# Altium footprint library 我的器件.PCBLIB: 450 footprints (part 9 of 29)
Each footprint in its own frame and in the unit in brackets; x right, y up, seen from the top. Pads: shape width x height; smd on the part's side, far side on the other; paste and mask are expansions set on the pad; w line width, h text height; cw(c..) or ccw(c..) is an arc to the next point about the centre after c.
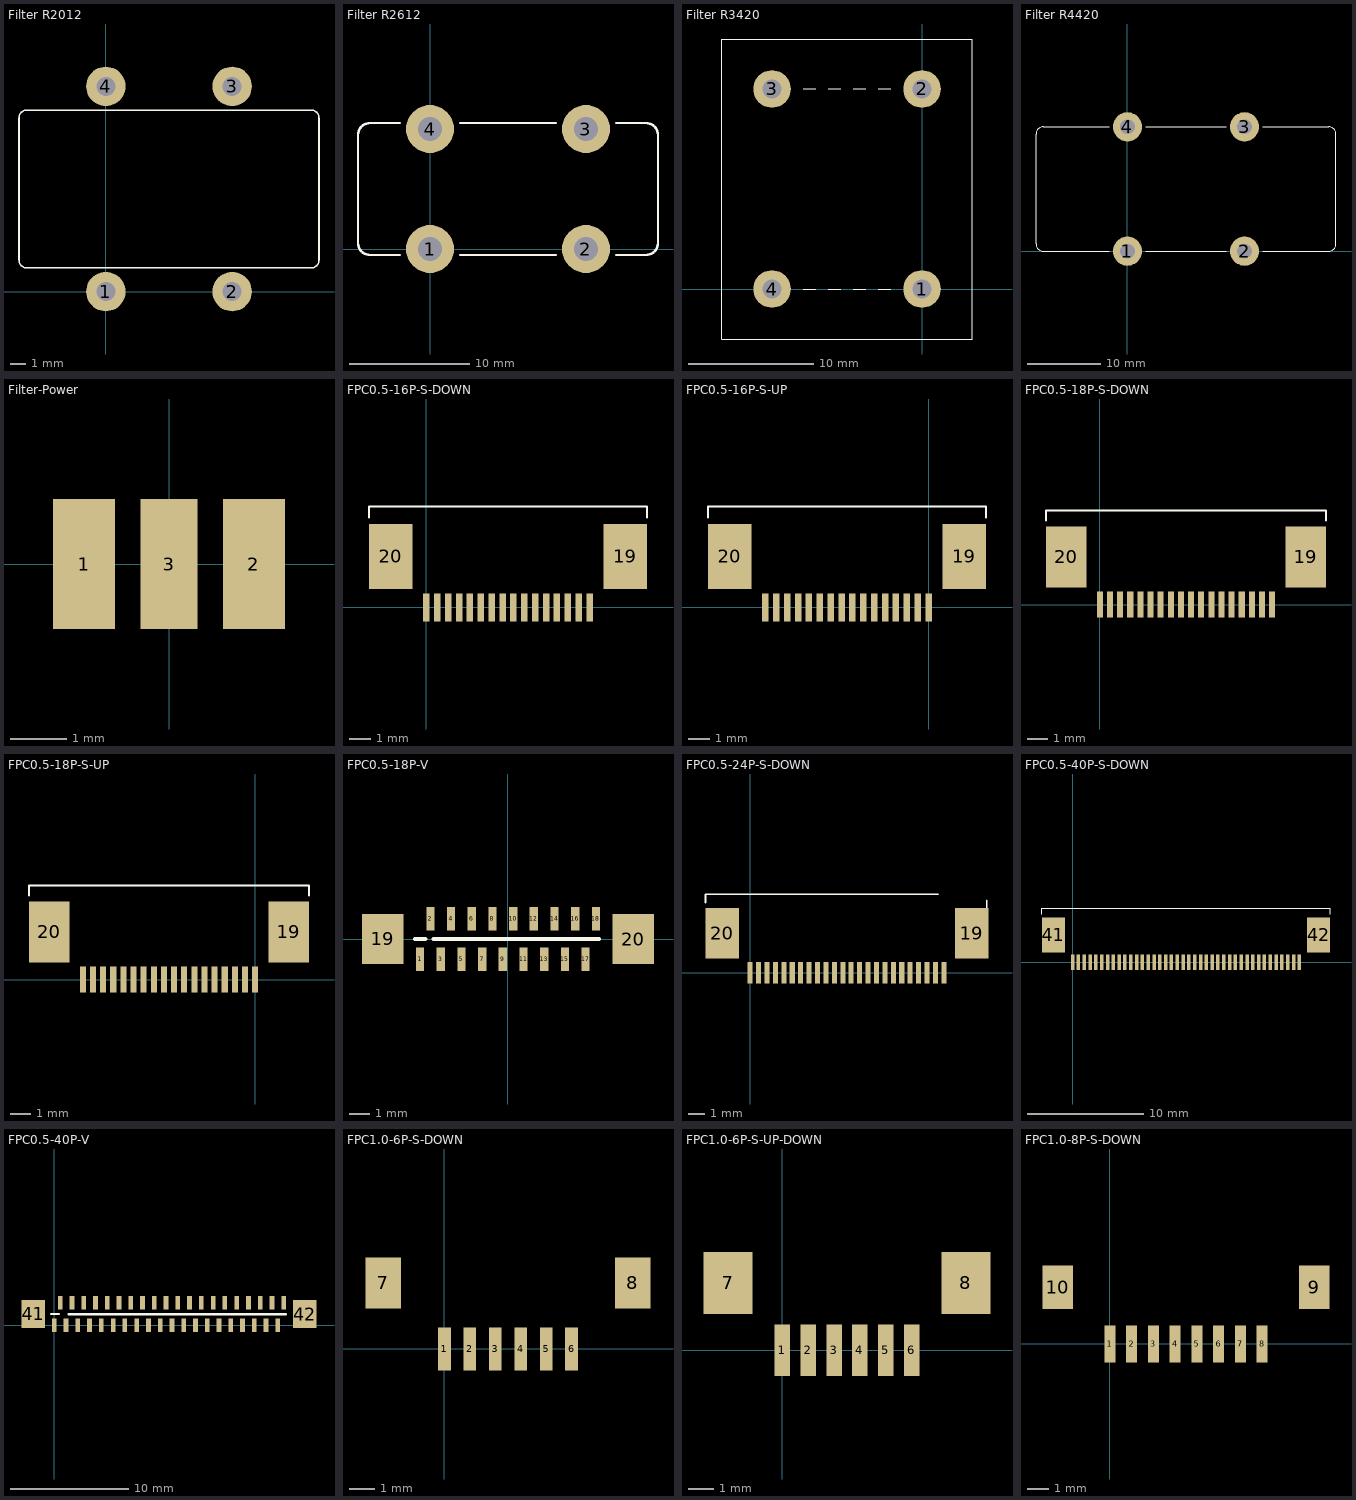
[diagram p8: the footprints below, top view; thin cyan lines are the x and y axes]

## Filter R2012 [mm]
pads (4):
  round 2.5 hole 1.2: 1(0,0) 2(8,0) 3(8,13) 4(0,13)
Top Overlay:
  lines w0.1: -5.5,2 ccw(c-5,2) -5,1.5 13,1.5 ccw(c13,2) 13.5,2 13.5,11 ccw(c13,11) 13,11.5 -5,11.5 ccw(c-5,11) -5.5,11 -5.5,2
3D body: height 6.1, standoff 1.66, extent -0.998,10.56 0.998,13.8
3D body: height 3, standoff -2, extent -0.399,12.6 0.399,13.397
3D body: height 6.1, standoff 1.66, extent 7.002,10.56 8.998,13.8
3D body: height 3, standoff -2, extent 7.601,12.6 8.399,13.397
3D body: height 6.1, standoff 1.66, extent 7.002,-0.8 8.998,2.44
3D body: height 3, standoff -2, extent 7.601,-0.397 8.399,0.4
3D body: height 3, standoff -2, extent -0.399,-0.397 0.399,0.4
3D body: height 6.1, standoff 1.66, extent -0.998,-0.8 0.998,2.44
3D body: height 19.92, standoff 0, extent -6.061,0.5 13.9,12.5

## Filter R2612 [mm]
pads (4):
  round 4 hole 2: 1(0,0) 2(13,0) 3(13,10) 4(0,10)
Top Overlay:
  lines w0.2: -2.5,-0.5 -5,-0.5 cw(c-5,0.5) -6,0.5 -6,9.5 cw(c-5,9.5) -5,10.5 -2.5,10.5 ; 2.5,-0.5 10.5,-0.5 ; 2.5,10.5 10.5,10.5 ; 15.5,-0.5 18,-0.5 ccw(c18,0.5) 19,0.5 19,9.5 ccw(c18,9.5) 18,10.5 15.5,10.5
3D body: height 25.9, standoff 0, extent -6.449,-1 19.5,11

## Filter R3420 [mm]
pads (4):
  round 3 hole 1.5: 1(0,0) 2(0,16) 3(-12,16) 4(-12,0)
Top Overlay:
  lines w0.1: -9.5,0 -8.5,0 ; -9.5,16 -8.5,16 ; -7.5,0 -6.5,0 ; -7.5,16 -6.5,16 ; -5.5,0 -4.5,0 ; -5.5,16 -4.5,16 ; -3.5,0 -2.5,0 ; -3.5,16 -2.5,16 ; -16,-4 -16,20 4,20 4,-4 -16,-4
3D body: height 34.87, standoff 1, extent -16.3,-9 4.3,24.933
3D body: height 1.6, standoff 0, extent -16,-4 4,20

## Filter R4420 [mm]
pads (4):
  round 4 hole 2: 1(0,0) 2(16,0) 3(16,17) 4(0,17)
Top Overlay:
  lines w0.1: -2.5,0 -11.5,0 cw(c-11.5,1) -12.5,1 -12.5,16 cw(c-11.5,16) -11.5,17 -2.5,17 ; 2.5,0 11.5,0 ; 2.5,17 11.5,17 ; 4.5,0 13.5,0 ; 4.5,17 13.5,17 ; 18.5,0 27.5,0 ccw(c27.5,1) 28.5,1 28.5,16 ccw(c27.5,16) 27.5,17 18.5,17
3D body: height 43.83, standoff 0, extent -13.957,-1.6 29.957,18.4

## Filter-Power [mm]
pads (3):
  rect 1.1x2.3 smd: 1(-1.5,0) 2(1.5,0)
  rect 1x2.3 smd: 3(0,0)
3D body: height 1.5, standoff 0, extent -0.5,-0.75 0.5,0.75
3D body: height 1.5, standoff 0, extent 1,-0.747 1.6,0.747
3D body: height 1.5, standoff 0, extent -1.6,-0.747 -1,0.747
3D body: height 1.35, standoff 0.15, extent -1.5,-0.6 1.5,0.595

## FPC0.5-16P-S-DOWN [mm]
pads (18):
  rect 0.3x1.3 smd: 1(0,0) 2(0.5,0) 3(1,0) 4(1.5,0) 5(2,0) 6(2.5,0) 7(3,0) 8(3.5,0) 9(4,0) 10(4.5,0) 11(5,0) 12(5.5,0) 13(6,0) 14(6.5,0) 15(7,0) 16(7.5,0)
  rect 2x3 smd: 19(9.15,2.35) 20(-1.65,2.35)
Top Overlay:
  lines w0.1: -2.65,4.15 -2.65,4.65 10.15,4.65 10.15,4.15
3D body: height 2, standoff 0.2, extent 8.05,3.675 10.55,4.875
3D body: height 1.9, standoff 0.1, extent 7.975,0.575 9.875,4.375
3D body: height 2, standoff 0, extent 8.25,0.5 10,3.575
3D body: height 1.7, standoff 0.3, extent 8.25,0.475 9.9,0.575
3D body: height 1.5, standoff 0.5, extent 9.9,0.475 10,1.075
3D body: height 2, standoff 0, extent 8.25,1.075 10,3.675
3D body: height 2, standoff 0, extent -2.5,1.075 -0.75,3.675
3D body: height 1.5, standoff 0.5, extent -2.5,0.475 -2.4,1.075
3D body: height 1.7, standoff 0.3, extent -2.4,0.475 -0.75,0.575
3D body: height 2, standoff 0, extent -2.5,0.5 -0.75,3.575
3D body: height 1.9, standoff 0.1, extent -2.375,0.675 9.85,0.875
3D body: height 1.9, standoff 0.1, extent -2.375,0.575 -0.475,4.375
3D body: height 0.5, standoff 0.1, extent -2.375,0.575 9.85,4.675
3D body: height 2, standoff 1.1, extent -0.55,3.675 9.05,4.875
3D body: height 2, standoff 0.2, extent -3.05,3.675 -0.55,4.875
3D body: height 1.9, standoff 1.5, extent -2.375,0.575 9.85,3.675
3D body: height 1.7, standoff 0.2, extent 3.9,0.475 4.1,0.775
3D body: height 0.3, standoff 0, extent 3.9,-0.325 4.1,0.525
3D body: height 1.7, standoff 0.2, extent 4.4,0.475 4.6,0.775
3D body: height 0.3, standoff 0, extent 4.4,-0.325 4.6,0.525
3D body: height 1.7, standoff 0.2, extent 4.9,0.475 5.1,0.775
3D body: height 0.3, standoff 0, extent 4.9,-0.325 5.1,0.525
3D body: height 1.7, standoff 0.2, extent 5.4,0.475 5.6,0.775
3D body: height 0.3, standoff 0, extent 5.4,-0.325 5.6,0.525
3D body: height 1.7, standoff 0.2, extent 5.9,0.475 6.1,0.775
3D body: height 0.3, standoff 0, extent 5.9,-0.325 6.1,0.525
3D body: height 1.7, standoff 0.2, extent 6.4,0.475 6.6,0.775
3D body: height 0.3, standoff 0, extent 6.4,-0.325 6.6,0.525
3D body: height 1.7, standoff 0.2, extent 6.9,0.475 7.1,0.775
3D body: height 0.3, standoff 0, extent 6.9,-0.325 7.1,0.525
3D body: height 1.7, standoff 0.2, extent 7.4,0.475 7.6,0.775
3D body: height 0.3, standoff 0, extent 7.4,-0.325 7.6,0.525
3D body: height 0.3, standoff 0, extent -0.1,-0.325 0.1,0.525
3D body: height 1.7, standoff 0.2, extent -0.1,0.475 0.1,0.775
3D body: height 0.3, standoff 0, extent 0.4,-0.325 0.6,0.525
3D body: height 1.7, standoff 0.2, extent 0.4,0.475 0.6,0.775
3D body: height 0.3, standoff 0, extent 0.9,-0.325 1.1,0.525
3D body: height 1.7, standoff 0.2, extent 0.9,0.475 1.1,0.775
3D body: height 0.3, standoff 0, extent 1.4,-0.325 1.6,0.525
3D body: height 1.7, standoff 0.2, extent 1.4,0.475 1.6,0.775
3D body: height 0.3, standoff 0, extent 1.9,-0.325 2.1,0.525
3D body: height 1.7, standoff 0.2, extent 1.9,0.475 2.1,0.775
3D body: height 0.3, standoff 0, extent 2.4,-0.325 2.6,0.525
3D body: height 1.7, standoff 0.2, extent 2.4,0.475 2.6,0.775
3D body: height 0.3, standoff 0, extent 2.9,-0.325 3.1,0.525
3D body: height 1.7, standoff 0.2, extent 2.9,0.475 3.1,0.775
3D body: height 0.3, standoff 0, extent 3.4,-0.325 3.6,0.525
3D body: height 1.7, standoff 0.2, extent 3.4,0.475 3.6,0.775

## FPC0.5-16P-S-UP [mm]
pads (18):
  rect 0.3x1.3 smd: 1(0,0) 2(-0.5,0) 3(-1,0) 4(-1.5,0) 5(-2,0) 6(-2.5,0) 7(-3,0) 8(-3.5,0) 9(-4,0) 10(-4.5,0) 11(-5,0) 12(-5.5,0) 13(-6,0) 14(-6.5,0) 15(-7,0) 16(-7.5,0)
  rect 2x3 smd: 19(1.65,2.35) 20(-9.15,2.35)
Top Overlay:
  lines w0.1: -10.15,4.15 -10.15,4.65 2.65,4.65 2.65,4.15
3D body: height 2, standoff 0, extent 0.75,1.075 2.5,3.675
3D body: height 1.5, standoff 0.5, extent 2.4,0.475 2.5,1.075
3D body: height 1.7, standoff 0.3, extent 0.75,0.475 2.4,0.575
3D body: height 2, standoff 0, extent 0.75,0.5 2.5,3.575
3D body: height 1.9, standoff 0.1, extent 0.475,0.575 2.375,4.375
3D body: height 2, standoff 0.2, extent 0.55,3.675 3.05,4.875
3D body: height 1.7, standoff 0.2, extent -5.1,0.475 -4.9,0.775
3D body: height 0.3, standoff 0, extent -5.1,-0.325 -4.9,0.525
3D body: height 1.7, standoff 0.2, extent -5.6,0.475 -5.4,0.775
3D body: height 0.3, standoff 0, extent -5.6,-0.325 -5.4,0.525
3D body: height 1.7, standoff 0.2, extent -6.1,0.475 -5.9,0.775
3D body: height 0.3, standoff 0, extent -6.1,-0.325 -5.9,0.525
3D body: height 1.7, standoff 0.2, extent -6.6,0.475 -6.4,0.775
3D body: height 0.3, standoff 0, extent -6.6,-0.325 -6.4,0.525
3D body: height 1.7, standoff 0.2, extent -7.1,0.475 -6.9,0.775
3D body: height 0.3, standoff 0, extent -7.1,-0.325 -6.9,0.525
3D body: height 1.7, standoff 0.2, extent -7.6,0.475 -7.4,0.775
3D body: height 0.3, standoff 0, extent -7.6,-0.325 -7.4,0.525
3D body: height 0.3, standoff 0, extent -0.1,-0.325 0.1,0.525
3D body: height 1.7, standoff 0.2, extent -0.1,0.475 0.1,0.775
3D body: height 0.3, standoff 0, extent -0.6,-0.325 -0.4,0.525
3D body: height 1.7, standoff 0.2, extent -0.6,0.475 -0.4,0.775
3D body: height 0.3, standoff 0, extent -1.1,-0.325 -0.9,0.525
3D body: height 1.7, standoff 0.2, extent -1.1,0.475 -0.9,0.775
3D body: height 0.3, standoff 0, extent -1.6,-0.325 -1.4,0.525
3D body: height 1.7, standoff 0.2, extent -1.6,0.475 -1.4,0.775
3D body: height 0.3, standoff 0, extent -2.1,-0.325 -1.9,0.525
3D body: height 1.7, standoff 0.2, extent -2.1,0.475 -1.9,0.775
3D body: height 0.3, standoff 0, extent -2.6,-0.325 -2.4,0.525
3D body: height 1.7, standoff 0.2, extent -2.6,0.475 -2.4,0.775
3D body: height 0.3, standoff 0, extent -3.1,-0.325 -2.9,0.525
3D body: height 1.7, standoff 0.2, extent -3.1,0.475 -2.9,0.775
3D body: height 0.3, standoff 0, extent -3.6,-0.325 -3.4,0.525
3D body: height 1.7, standoff 0.2, extent -3.6,0.475 -3.4,0.775
3D body: height 0.3, standoff 0, extent -4.1,-0.325 -3.9,0.525
3D body: height 1.7, standoff 0.2, extent -4.1,0.475 -3.9,0.775
3D body: height 0.3, standoff 0, extent -4.6,-0.325 -4.4,0.525
3D body: height 1.7, standoff 0.2, extent -4.6,0.475 -4.4,0.775
3D body: height 0.5, standoff 0.1, extent -9.9,0.575 2.4,3.675
3D body: height 0.9, standoff 0, extent -9.05,3.675 0.55,4.875
3D body: height 1.9, standoff 1.4, extent -9.9,0.575 2.4,4.675
3D body: height 1.9, standoff 0.1, extent -9.85,0.675 2.4,0.875
3D body: height 2, standoff 0, extent -10,1.075 -8.25,3.675
3D body: height 1.5, standoff 0.5, extent -10,0.475 -9.9,1.075
3D body: height 1.7, standoff 0.3, extent -9.9,0.475 -8.25,0.575
3D body: height 2, standoff 0, extent -10,0.5 -8.25,3.575
3D body: height 1.9, standoff 0.1, extent -9.875,0.575 -7.975,4.375
3D body: height 2, standoff 0.2, extent -10.55,3.675 -8.05,4.875

## FPC0.5-18P-S-DOWN [mm]
pads (20):
  rect 0.3x1.3 smd: 1(0,0) 2(0.5,0) 3(1,0) 4(1.5,0) 5(2,0) 6(2.5,0) 7(3,0) 8(3.5,0) 9(4,0) 10(4.5,0) 11(5,0) 12(5.5,0) 13(6,0) 14(6.5,0) 15(7,0) 16(7.5,0) 17(8,0) 18(8.5,0)
  rect 2x3 smd: 19(10.15,2.35) 20(-1.65,2.35)
Top Overlay:
  lines w0.1: -2.65,4.15 -2.65,4.65 11.15,4.65 11.15,4.15
3D body: height 2, standoff 0, extent 9.25,1.075 11,3.675
3D body: height 1.5, standoff 0.5, extent 10.9,0.475 11,1.075
3D body: height 1.7, standoff 0.3, extent 9.25,0.475 10.9,0.575
3D body: height 2, standoff 0, extent 9.25,0.5 11,3.575
3D body: height 1.9, standoff 0.1, extent 8.975,0.575 10.875,4.375
3D body: height 2, standoff 0.2, extent 9.05,3.675 11.55,4.875
3D body: height 2, standoff 0, extent -2.5,1.075 -0.75,3.675
3D body: height 1.5, standoff 0.5, extent -2.5,0.475 -2.4,1.075
3D body: height 1.7, standoff 0.3, extent -2.4,0.475 -0.75,0.575
3D body: height 2, standoff 0, extent -2.5,0.5 -0.75,3.575
3D body: height 1.9, standoff 0.1, extent -2.375,0.675 10.9,0.875
3D body: height 1.9, standoff 0.1, extent -2.375,0.575 -0.475,4.375
3D body: height 0.5, standoff 0.1, extent -2.375,0.575 10.9,4.675
3D body: height 2, standoff 1.1, extent -0.55,3.675 9.05,4.875
3D body: height 2, standoff 0.2, extent -3.05,3.675 -0.55,4.875
3D body: height 1.9, standoff 1.5, extent -2.375,0.575 10.9,3.675
3D body: height 1.7, standoff 0.2, extent 3.9,0.475 4.1,0.775
3D body: height 0.3, standoff 0, extent 3.9,-0.325 4.1,0.525
3D body: height 1.7, standoff 0.2, extent 4.4,0.475 4.6,0.775
3D body: height 0.3, standoff 0, extent 4.4,-0.325 4.6,0.525
3D body: height 1.7, standoff 0.2, extent 4.9,0.475 5.1,0.775
3D body: height 0.3, standoff 0, extent 4.9,-0.325 5.1,0.525
3D body: height 1.7, standoff 0.2, extent 5.4,0.475 5.6,0.775
3D body: height 0.3, standoff 0, extent 5.4,-0.325 5.6,0.525
3D body: height 1.7, standoff 0.2, extent 5.9,0.475 6.1,0.775
3D body: height 0.3, standoff 0, extent 5.9,-0.325 6.1,0.525
3D body: height 1.7, standoff 0.2, extent 6.4,0.475 6.6,0.775
3D body: height 0.3, standoff 0, extent 6.4,-0.325 6.6,0.525
3D body: height 1.7, standoff 0.2, extent 6.9,0.475 7.1,0.775
3D body: height 0.3, standoff 0, extent 6.9,-0.325 7.1,0.525
3D body: height 1.7, standoff 0.2, extent 7.4,0.475 7.6,0.775
3D body: height 0.3, standoff 0, extent 7.4,-0.325 7.6,0.525
3D body: height 1.7, standoff 0.2, extent 7.9,0.475 8.1,0.775
3D body: height 0.3, standoff 0, extent 7.9,-0.325 8.1,0.525
3D body: height 1.7, standoff 0.2, extent 8.4,0.475 8.6,0.775
3D body: height 0.3, standoff 0, extent 8.4,-0.325 8.6,0.525
3D body: height 0.3, standoff 0, extent -0.1,-0.325 0.1,0.525
3D body: height 1.7, standoff 0.2, extent -0.1,0.475 0.1,0.775
3D body: height 0.3, standoff 0, extent 0.4,-0.325 0.6,0.525
3D body: height 1.7, standoff 0.2, extent 0.4,0.475 0.6,0.775
3D body: height 0.3, standoff 0, extent 0.9,-0.325 1.1,0.525
3D body: height 1.7, standoff 0.2, extent 0.9,0.475 1.1,0.775
3D body: height 0.3, standoff 0, extent 1.4,-0.325 1.6,0.525
3D body: height 1.7, standoff 0.2, extent 1.4,0.475 1.6,0.775
3D body: height 0.3, standoff 0, extent 1.9,-0.325 2.1,0.525
3D body: height 1.7, standoff 0.2, extent 1.9,0.475 2.1,0.775
3D body: height 0.3, standoff 0, extent 2.4,-0.325 2.6,0.525
3D body: height 1.7, standoff 0.2, extent 2.4,0.475 2.6,0.775
3D body: height 0.3, standoff 0, extent 2.9,-0.325 3.1,0.525
3D body: height 1.7, standoff 0.2, extent 2.9,0.475 3.1,0.775
3D body: height 0.3, standoff 0, extent 3.4,-0.325 3.6,0.525
3D body: height 1.7, standoff 0.2, extent 3.4,0.475 3.6,0.775

## FPC0.5-18P-S-UP [mm]
pads (20):
  rect 0.3x1.3 smd: 1(0,0) 2(-0.5,0) 3(-1,0) 4(-1.5,0) 5(-2,0) 6(-2.5,0) 7(-3,0) 8(-3.5,0) 9(-4,0) 10(-4.5,0) 11(-5,0) 12(-5.5,0) 13(-6,0) 14(-6.5,0) 15(-7,0) 16(-7.5,0) 17(-8,0) 18(-8.5,0)
  rect 2x3 smd: 19(1.65,2.35) 20(-10.15,2.35)
Top Overlay:
  lines w0.1: -11.15,4.15 -11.15,4.65 2.65,4.65 2.65,4.15
3D body: height 2, standoff 0, extent 0.75,1.075 2.5,3.675
3D body: height 1.5, standoff 0.5, extent 2.4,0.475 2.5,1.075
3D body: height 1.7, standoff 0.3, extent 0.75,0.475 2.4,0.575
3D body: height 2, standoff 0, extent 0.75,0.5 2.5,3.575
3D body: height 1.9, standoff 0.1, extent 0.475,0.575 2.375,4.375
3D body: height 2, standoff 0.2, extent 0.55,3.675 3.05,4.875
3D body: height 1.7, standoff 0.2, extent -5.1,0.475 -4.9,0.775
3D body: height 0.3, standoff 0, extent -5.1,-0.325 -4.9,0.525
3D body: height 1.7, standoff 0.2, extent -5.6,0.475 -5.4,0.775
3D body: height 0.3, standoff 0, extent -5.6,-0.325 -5.4,0.525
3D body: height 1.7, standoff 0.2, extent -6.1,0.475 -5.9,0.775
3D body: height 0.3, standoff 0, extent -6.1,-0.325 -5.9,0.525
3D body: height 1.7, standoff 0.2, extent -6.6,0.475 -6.4,0.775
3D body: height 0.3, standoff 0, extent -6.6,-0.325 -6.4,0.525
3D body: height 1.7, standoff 0.2, extent -7.1,0.475 -6.9,0.775
3D body: height 0.3, standoff 0, extent -7.1,-0.325 -6.9,0.525
3D body: height 1.7, standoff 0.2, extent -7.6,0.475 -7.4,0.775
3D body: height 0.3, standoff 0, extent -7.6,-0.325 -7.4,0.525
3D body: height 1.7, standoff 0.2, extent -8.1,0.475 -7.9,0.775
3D body: height 0.3, standoff 0, extent -8.1,-0.325 -7.9,0.525
3D body: height 1.7, standoff 0.2, extent -8.6,0.475 -8.4,0.775
3D body: height 0.3, standoff 0, extent -8.6,-0.325 -8.4,0.525
3D body: height 0.3, standoff 0, extent -0.1,-0.325 0.1,0.525
3D body: height 1.7, standoff 0.2, extent -0.1,0.475 0.1,0.775
3D body: height 0.3, standoff 0, extent -0.6,-0.325 -0.4,0.525
3D body: height 1.7, standoff 0.2, extent -0.6,0.475 -0.4,0.775
3D body: height 0.3, standoff 0, extent -1.1,-0.325 -0.9,0.525
3D body: height 1.7, standoff 0.2, extent -1.1,0.475 -0.9,0.775
3D body: height 0.3, standoff 0, extent -1.6,-0.325 -1.4,0.525
3D body: height 1.7, standoff 0.2, extent -1.6,0.475 -1.4,0.775
3D body: height 0.3, standoff 0, extent -2.1,-0.325 -1.9,0.525
3D body: height 1.7, standoff 0.2, extent -2.1,0.475 -1.9,0.775
3D body: height 0.3, standoff 0, extent -2.6,-0.325 -2.4,0.525
3D body: height 1.7, standoff 0.2, extent -2.6,0.475 -2.4,0.775
3D body: height 0.3, standoff 0, extent -3.1,-0.325 -2.9,0.525
3D body: height 1.7, standoff 0.2, extent -3.1,0.475 -2.9,0.775
3D body: height 0.3, standoff 0, extent -3.6,-0.325 -3.4,0.525
3D body: height 1.7, standoff 0.2, extent -3.6,0.475 -3.4,0.775
3D body: height 0.3, standoff 0, extent -4.1,-0.325 -3.9,0.525
3D body: height 1.7, standoff 0.2, extent -4.1,0.475 -3.9,0.775
3D body: height 0.3, standoff 0, extent -4.6,-0.325 -4.4,0.525
3D body: height 1.7, standoff 0.2, extent -4.6,0.475 -4.4,0.775
3D body: height 0.5, standoff 0.1, extent -10.875,0.575 2.4,3.675
3D body: height 2, standoff 0.2, extent -11.55,3.675 -9.05,4.875
3D body: height 0.9, standoff 0, extent -9.05,3.675 0.55,4.875
3D body: height 1.9, standoff 1.4, extent -10.875,0.575 2.4,4.675
3D body: height 1.9, standoff 0.1, extent -10.875,0.575 -8.975,4.375
3D body: height 1.9, standoff 0.1, extent -10.875,0.675 2.4,0.875
3D body: height 2, standoff 0, extent -11,0.5 -9.25,3.575
3D body: height 1.7, standoff 0.3, extent -10.9,0.475 -9.25,0.575
3D body: height 1.5, standoff 0.5, extent -11,0.475 -10.9,1.075
3D body: height 2, standoff 0, extent -11,1.075 -9.25,3.675

## FPC0.5-18P-V [mm]
pads (20):
  rect 0.4x1.15 smd: 1(-4.25,-0.975) 2(-3.75,0.975) 3(-3.25,-0.975) 4(-2.75,0.975) 5(-2.25,-0.975) 6(-1.75,0.975) 7(-1.25,-0.975) 8(-0.75,0.975) 9(-0.25,-0.975) 10(0.25,0.975) 11(0.75,-0.975) 12(1.25,0.975) 13(1.75,-0.975) 14(2.25,0.975) 15(2.75,-0.975) 16(3.25,0.975) 17(3.75,-0.975) 18(4.25,0.975)
  rect 2x2.4 smd: 19(-6.05,0) 20(6.05,0)
Top Overlay:
  lines w0.2: -4.5,0 -4,0 ; -3.6,0 4.4,0
3D body: height 1, standoff 0.4, extent -6.8,-1 6.8,1
3D body: height 4.4, standoff 2.8, extent -7.3,-1 7.3,1
3D body: height 4.4, standoff 0.4, extent -5.35,-1 5.35,-0.5
3D body: height 2.8, standoff 0.4, extent -6.8,-1 6.8,1
3D body: height 0.3, standoff 0, extent -4.35,-1.5 -4.15,-0.55
3D body: height 0.4, standoff 0, extent -4.35,-0.85 -4.15,-0.55
3D body: height 2.6, standoff 0, extent -6.825,-1.025 -5.35,1.025
3D body: height 2.6, standoff 0, extent 5.35,-1.025 6.825,1.025
3D body: height 0.4, standoff 0, extent -3.35,-0.85 -3.15,-0.55
3D body: height 0.3, standoff 0, extent -3.35,-1.5 -3.15,-0.55
3D body: height 0.4, standoff 0, extent -2.35,-0.85 -2.15,-0.55
3D body: height 0.3, standoff 0, extent -2.35,-1.5 -2.15,-0.55
3D body: height 0.4, standoff 0, extent -1.35,-0.85 -1.15,-0.55
3D body: height 0.3, standoff 0, extent -1.35,-1.5 -1.15,-0.55
3D body: height 0.4, standoff 0, extent -0.35,-0.85 -0.15,-0.55
3D body: height 0.3, standoff 0, extent -0.35,-1.5 -0.15,-0.55
3D body: height 0.4, standoff 0, extent 0.65,-0.85 0.85,-0.55
3D body: height 0.3, standoff 0, extent 0.65,-1.5 0.85,-0.55
3D body: height 0.4, standoff 0, extent 1.65,-0.85 1.85,-0.55
3D body: height 0.3, standoff 0, extent 1.65,-1.5 1.85,-0.55
3D body: height 0.4, standoff 0, extent 2.65,-0.85 2.85,-0.55
3D body: height 0.3, standoff 0, extent 2.65,-1.5 2.85,-0.55
3D body: height 0.4, standoff 0, extent 3.65,-0.85 3.85,-0.55
3D body: height 0.3, standoff 0, extent 3.65,-1.5 3.85,-0.55
3D body: height 0.4, standoff 0, extent 4.15,0.55 4.35,0.85
3D body: height 0.3, standoff 0, extent 4.15,0.55 4.35,1.5
3D body: height 0.4, standoff 0, extent 3.15,0.55 3.35,0.85
3D body: height 0.3, standoff 0, extent 3.15,0.55 3.35,1.5
3D body: height 0.4, standoff 0, extent 2.15,0.55 2.35,0.85
3D body: height 0.3, standoff 0, extent 2.15,0.55 2.35,1.5
3D body: height 0.4, standoff 0, extent 1.15,0.55 1.35,0.85
3D body: height 0.3, standoff 0, extent 1.15,0.55 1.35,1.5
3D body: height 0.4, standoff 0, extent 0.15,0.55 0.35,0.85
3D body: height 0.3, standoff 0, extent 0.15,0.55 0.35,1.5
3D body: height 0.4, standoff 0, extent -0.85,0.55 -0.65,0.85
3D body: height 0.3, standoff 0, extent -0.85,0.55 -0.65,1.5
3D body: height 0.4, standoff 0, extent -1.85,0.55 -1.65,0.85
3D body: height 0.3, standoff 0, extent -1.85,0.55 -1.65,1.5
3D body: height 0.4, standoff 0, extent -2.85,0.55 -2.65,0.85
3D body: height 0.3, standoff 0, extent -2.85,0.55 -2.65,1.5
3D body: height 0.4, standoff 0, extent -3.85,0.55 -3.65,0.85
3D body: height 0.3, standoff 0, extent -3.85,0.55 -3.65,1.5

## FPC0.5-24P-S-DOWN [mm]
pads (26):
  rect 0.3x1.3 smd: 1(0,0) 2(0.5,0) 3(1,0) 4(1.5,0) 5(2,0) 6(2.5,0) 7(3,0) 8(3.5,0) 9(4,0) 10(4.5,0) 11(5,0) 12(5.5,0) 13(6,0) 14(6.5,0) 15(7,0) 16(7.5,0) 17(8,0) 18(8.5,0) 19(9,0) 20(9.5,0) 21(10,0) 22(10.5,0) 23(11,0) 24(11.5,0)
  rect 2x3 smd: 19(13.15,2.35) 20(-1.65,2.35)
Top Overlay:
  lines w0.1: -2.65,4.15 -2.65,4.65 11.15,4.65 ; 14.05,3.8 14.05,4.3
3D body: height 1.7, standoff 0.2, extent 3.4,0.475 3.6,0.775
3D body: height 0.3, standoff 0, extent 3.4,-0.325 3.6,0.525
3D body: height 1.7, standoff 0.2, extent 2.9,0.475 3.1,0.775
3D body: height 0.3, standoff 0, extent 2.9,-0.325 3.1,0.525
3D body: height 1.7, standoff 0.2, extent 2.4,0.475 2.6,0.775
3D body: height 0.3, standoff 0, extent 2.4,-0.325 2.6,0.525
3D body: height 1.7, standoff 0.2, extent 1.9,0.475 2.1,0.775
3D body: height 0.3, standoff 0, extent 1.9,-0.325 2.1,0.525
3D body: height 1.7, standoff 0.2, extent 1.4,0.475 1.6,0.775
3D body: height 0.3, standoff 0, extent 1.4,-0.325 1.6,0.525
3D body: height 1.7, standoff 0.2, extent 0.9,0.475 1.1,0.775
3D body: height 0.3, standoff 0, extent 0.9,-0.325 1.1,0.525
3D body: height 1.7, standoff 0.2, extent 0.4,0.475 0.6,0.775
3D body: height 0.3, standoff 0, extent 0.4,-0.325 0.6,0.525
3D body: height 1.7, standoff 0.2, extent -0.1,0.475 0.1,0.775
3D body: height 0.3, standoff 0, extent -0.1,-0.325 0.1,0.525
3D body: height 0.3, standoff 0, extent 8.4,-0.325 8.6,0.525
3D body: height 1.7, standoff 0.2, extent 8.4,0.475 8.6,0.775
3D body: height 0.3, standoff 0, extent 7.9,-0.325 8.1,0.525
3D body: height 1.7, standoff 0.2, extent 7.9,0.475 8.1,0.775
3D body: height 0.3, standoff 0, extent 7.4,-0.325 7.6,0.525
3D body: height 1.7, standoff 0.2, extent 7.4,0.475 7.6,0.775
3D body: height 0.3, standoff 0, extent 6.9,-0.325 7.1,0.525
3D body: height 1.7, standoff 0.2, extent 6.9,0.475 7.1,0.775
3D body: height 0.3, standoff 0, extent 6.4,-0.325 6.6,0.525
3D body: height 1.7, standoff 0.2, extent 6.4,0.475 6.6,0.775
3D body: height 0.3, standoff 0, extent 5.9,-0.325 6.1,0.525
3D body: height 1.7, standoff 0.2, extent 5.9,0.475 6.1,0.775
3D body: height 0.3, standoff 0, extent 5.4,-0.325 5.6,0.525
3D body: height 1.7, standoff 0.2, extent 5.4,0.475 5.6,0.775
3D body: height 0.3, standoff 0, extent 4.9,-0.325 5.1,0.525
3D body: height 1.7, standoff 0.2, extent 4.9,0.475 5.1,0.775
3D body: height 0.3, standoff 0, extent 4.4,-0.325 4.6,0.525
3D body: height 1.7, standoff 0.2, extent 4.4,0.475 4.6,0.775
3D body: height 0.3, standoff 0, extent 3.9,-0.325 4.1,0.525
3D body: height 1.7, standoff 0.2, extent 3.9,0.475 4.1,0.775
3D body: height 1.9, standoff 1.5, extent -2.375,0.575 10.9,3.675
3D body: height 2, standoff 0.2, extent -3.05,3.675 -0.55,4.875
3D body: height 2, standoff 1.1, extent -0.55,3.675 11.65,4.875
3D body: height 1.9, standoff 0.1, extent -2.375,0.575 -0.475,3.675
3D body: height 1.9, standoff 0.1, extent -2.375,0.675 10.9,0.875
3D body: height 2, standoff 0, extent -2.5,0.5 -0.75,3.575
3D body: height 1.7, standoff 0.3, extent -2.4,0.475 -0.75,0.575
3D body: height 1.5, standoff 0.5, extent -2.5,0.475 -2.4,1.075
3D body: height 2, standoff 0, extent -2.5,1.075 -0.75,3.675
3D body: height 2, standoff 0.2, extent 11.65,3.675 14.15,4.875
3D body: height 1.7, standoff 0.3, extent 12.25,0.475 13.9,0.575
3D body: height 2, standoff 0, extent 12.25,0.5 14,3.575
3D body: height 1.9, standoff 0.1, extent 11.975,0.575 13.875,3.675
3D body: height 1.9, standoff 0.1, extent 0.625,0.675 13.9,0.875
3D body: height 0.5, standoff 0.1, extent -2.175,0.575 13.9,4.65
3D body: height 1.9, standoff 1.5, extent -0.475,0.575 13.9,3.675
3D body: height 1.7, standoff 0.2, extent 8.9,0.475 9.1,0.775
3D body: height 0.3, standoff 0, extent 8.9,-0.325 9.1,0.525
3D body: height 1.7, standoff 0.2, extent 9.4,0.475 9.6,0.775
3D body: height 0.3, standoff 0, extent 9.4,-0.325 9.6,0.525
3D body: height 1.7, standoff 0.2, extent 9.9,0.475 10.1,0.775
3D body: height 0.3, standoff 0, extent 9.9,-0.325 10.1,0.525
3D body: height 1.7, standoff 0.2, extent 10.4,0.475 10.6,0.775
3D body: height 0.3, standoff 0, extent 10.4,-0.325 10.6,0.525
3D body: height 0.3, standoff 0, extent 10.9,-0.325 11.1,0.525
3D body: height 1.7, standoff 0.2, extent 11.4,0.475 11.6,0.775
3D body: height 0.3, standoff 0, extent 11.4,-0.325 11.6,0.525
3D body: height 1.7, standoff 0.2, extent 10.9,0.475 11.1,0.775

## FPC0.5-40P-S-DOWN [mm]
pads (42):
  rect 0.3x1.3 smd: 1(0,0) 2(0.5,0) 3(1,0) 4(1.5,0) 5(2,0) 6(2.5,0) 7(3,0) 8(3.5,0) 9(4,0) 10(4.5,0) 11(5,0) 12(5.5,0) 13(6,0) 14(6.5,0) 15(7,0) 16(7.5,0) 17(8,0) 18(8.5,0) 19(9,0) 20(9.5,0) 21(10,0) 22(10.5,0) 23(11,0) 24(11.5,0) 25(12,0) 26(12.5,0) 27(13,0) 28(13.5,0) 29(14,0) 30(14.5,0) 31(15,0) 32(15.5,0) 33(16,0) 34(16.5,0) 35(17,0) 36(17.5,0) 37(18,0) 38(18.5,0) 39(19,0) 40(19.5,0)
  rect 2x3 smd: 41(-1.65,2.35) 42(21.15,2.35)
Top Overlay:
  lines w0.1: -2.65,4.15 -2.65,4.65 22.15,4.65 22.15,4.15
3D body: height 2, standoff 0, extent 20.3,1.075 22.05,3.675
3D body: height 1.5, standoff 0.5, extent 20.3,0.475 20.4,1.075
3D body: height 1.7, standoff 0.3, extent 20.4,0.475 22.05,0.575
3D body: height 2, standoff 0, extent 20.3,0.5 22.05,3.575
3D body: height 2, standoff 0.2, extent 19.75,3.675 22.25,4.875
3D body: height 1.7, standoff 0.2, extent 3.4,0.475 3.6,0.775
3D body: height 0.3, standoff 0, extent 3.4,-0.325 3.6,0.525
3D body: height 1.7, standoff 0.2, extent 2.9,0.475 3.1,0.775
3D body: height 0.3, standoff 0, extent 2.9,-0.325 3.1,0.525
3D body: height 1.7, standoff 0.2, extent 2.4,0.475 2.6,0.775
3D body: height 0.3, standoff 0, extent 2.4,-0.325 2.6,0.525
3D body: height 1.7, standoff 0.2, extent 1.9,0.475 2.1,0.775
3D body: height 0.3, standoff 0, extent 1.9,-0.325 2.1,0.525
3D body: height 1.7, standoff 0.2, extent 1.4,0.475 1.6,0.775
3D body: height 0.3, standoff 0, extent 1.4,-0.325 1.6,0.525
3D body: height 1.7, standoff 0.2, extent 0.9,0.475 1.1,0.775
3D body: height 0.3, standoff 0, extent 0.9,-0.325 1.1,0.525
3D body: height 1.7, standoff 0.2, extent 0.4,0.475 0.6,0.775
3D body: height 0.3, standoff 0, extent 0.4,-0.325 0.6,0.525
3D body: height 1.7, standoff 0.2, extent -0.1,0.475 0.1,0.775
3D body: height 0.3, standoff 0, extent -0.1,-0.325 0.1,0.525
3D body: height 0.3, standoff 0, extent 8.4,-0.325 8.6,0.525
3D body: height 1.7, standoff 0.2, extent 8.4,0.475 8.6,0.775
3D body: height 0.3, standoff 0, extent 7.9,-0.325 8.1,0.525
3D body: height 1.7, standoff 0.2, extent 7.9,0.475 8.1,0.775
3D body: height 0.3, standoff 0, extent 7.4,-0.325 7.6,0.525
3D body: height 1.7, standoff 0.2, extent 7.4,0.475 7.6,0.775
3D body: height 0.3, standoff 0, extent 6.9,-0.325 7.1,0.525
3D body: height 1.7, standoff 0.2, extent 6.9,0.475 7.1,0.775
3D body: height 0.3, standoff 0, extent 6.4,-0.325 6.6,0.525
3D body: height 1.7, standoff 0.2, extent 6.4,0.475 6.6,0.775
3D body: height 0.3, standoff 0, extent 5.9,-0.325 6.1,0.525
3D body: height 1.7, standoff 0.2, extent 5.9,0.475 6.1,0.775
3D body: height 0.3, standoff 0, extent 5.4,-0.325 5.6,0.525
3D body: height 1.7, standoff 0.2, extent 5.4,0.475 5.6,0.775
3D body: height 0.3, standoff 0, extent 4.9,-0.325 5.1,0.525
3D body: height 1.7, standoff 0.2, extent 4.9,0.475 5.1,0.775
3D body: height 0.3, standoff 0, extent 4.4,-0.325 4.6,0.525
3D body: height 1.7, standoff 0.2, extent 4.4,0.475 4.6,0.775
3D body: height 0.3, standoff 0, extent 3.9,-0.325 4.1,0.525
3D body: height 1.7, standoff 0.2, extent 3.9,0.475 4.1,0.775
3D body: height 1.9, standoff 1.5, extent -2.375,0.575 21.875,3.675
3D body: height 2, standoff 0.2, extent -3.05,3.675 -0.55,4.875
3D body: height 2, standoff 1.1, extent -0.55,3.675 20.05,4.875
3D body: height 0.5, standoff 0.1, extent -2.375,0.575 21.9,4.675
3D body: height 1.9, standoff 0.1, extent -2.375,0.575 -0.475,4.375
3D body: height 1.9, standoff 0.1, extent -2.375,0.675 21.875,0.875
3D body: height 2, standoff 0, extent -2.5,0.5 -0.75,3.575
3D body: height 1.7, standoff 0.3, extent -2.4,0.475 -0.75,0.575
3D body: height 1.5, standoff 0.5, extent -2.5,0.475 -2.4,1.075
3D body: height 2, standoff 0, extent -2.5,1.075 -0.75,3.675
3D body: height 1.7, standoff 0.2, extent 12.4,0.475 12.6,0.775
3D body: height 0.3, standoff 0, extent 12.4,-0.325 12.6,0.525
3D body: height 1.7, standoff 0.2, extent 12.9,0.475 13.1,0.775
3D body: height 0.3, standoff 0, extent 12.9,-0.325 13.1,0.525
3D body: height 1.7, standoff 0.2, extent 13.4,0.475 13.6,0.775
3D body: height 0.3, standoff 0, extent 13.4,-0.325 13.6,0.525
3D body: height 1.7, standoff 0.2, extent 13.9,0.475 14.1,0.775
3D body: height 0.3, standoff 0, extent 13.9,-0.325 14.1,0.525
3D body: height 1.7, standoff 0.2, extent 14.4,0.475 14.6,0.775
3D body: height 0.3, standoff 0, extent 14.4,-0.325 14.6,0.525
3D body: height 1.7, standoff 0.2, extent 14.9,0.475 15.1,0.775
3D body: height 0.3, standoff 0, extent 14.9,-0.325 15.1,0.525
3D body: height 1.7, standoff 0.2, extent 15.4,0.475 15.6,0.775
3D body: height 0.3, standoff 0, extent 15.4,-0.325 15.6,0.525
3D body: height 1.7, standoff 0.2, extent 15.9,0.475 16.1,0.775
3D body: height 0.3, standoff 0, extent 15.9,-0.325 16.1,0.525
3D body: height 1.7, standoff 0.2, extent 16.4,0.475 16.6,0.775
3D body: height 0.3, standoff 0, extent 16.4,-0.325 16.6,0.525
3D body: height 1.7, standoff 0.2, extent 16.9,0.475 17.1,0.775
3D body: height 0.3, standoff 0, extent 16.9,-0.325 17.1,0.525
3D body: height 0.3, standoff 0, extent 8.9,-0.325 9.1,0.525
3D body: height 1.7, standoff 0.2, extent 8.9,0.475 9.1,0.775
3D body: height 0.3, standoff 0, extent 9.4,-0.325 9.6,0.525
3D body: height 1.7, standoff 0.2, extent 9.4,0.475 9.6,0.775
3D body: height 0.3, standoff 0, extent 9.9,-0.325 10.1,0.525
3D body: height 1.7, standoff 0.2, extent 9.9,0.475 10.1,0.775
3D body: height 0.3, standoff 0, extent 10.4,-0.325 10.6,0.525
3D body: height 1.7, standoff 0.2, extent 10.4,0.475 10.6,0.775
3D body: height 0.3, standoff 0, extent 10.9,-0.325 11.1,0.525
3D body: height 1.7, standoff 0.2, extent 10.9,0.475 11.1,0.775
3D body: height 0.3, standoff 0, extent 11.4,-0.325 11.6,0.525
3D body: height 1.7, standoff 0.2, extent 11.4,0.475 11.6,0.775
3D body: height 0.3, standoff 0, extent 11.9,-0.325 12.1,0.525
3D body: height 1.7, standoff 0.2, extent 11.9,0.475 12.1,0.775
3D body: height 0.3, standoff 0, extent 19.4,-0.325 19.6,0.525
3D body: height 1.7, standoff 0.2, extent 19.4,0.475 19.6,0.775
3D body: height 0.3, standoff 0, extent 18.9,-0.325 19.1,0.525
3D body: height 1.7, standoff 0.2, extent 18.9,0.475 19.1,0.775
3D body: height 0.3, standoff 0, extent 18.4,-0.325 18.6,0.525
3D body: height 1.7, standoff 0.2, extent 18.4,0.475 18.6,0.775
3D body: height 0.3, standoff 0, extent 17.9,-0.325 18.1,0.525
3D body: height 1.7, standoff 0.2, extent 17.9,0.475 18.1,0.775
3D body: height 0.3, standoff 0, extent 17.4,-0.325 17.6,0.525
3D body: height 1.7, standoff 0.2, extent 17.4,0.475 17.6,0.775

## FPC0.5-40P-V [mm]
pads (42):
  rect 0.4x1.15 smd: 1(0,0) 2(0.5,1.95) 3(1,0) 4(1.5,1.95) 5(2,0) 6(2.5,1.95) 7(3,0) 8(3.5,1.95) 9(4,0) 10(4.5,1.95) 11(5,0) 12(5.5,1.95) 13(6,0) 14(6.5,1.95) 15(7,0) 16(7.5,1.95) 17(8,0) 18(8.5,1.95) 19(9,0) 20(9.5,1.95) 21(10,0) 22(10.5,1.95) 23(11,0) 24(11.5,1.95) 25(12,0) 26(12.5,1.95) 27(13,0) 28(13.5,1.95) 29(14,0) 30(14.5,1.95) 31(15,0) 32(15.5,1.95) 33(16,0) 34(16.5,1.95) 35(17,0) 36(17.5,1.95) 37(18,0) 38(18.5,1.95) 39(19,0) 40(19.5,1.95)
  rect 2x2.4 smd: 41(-1.8,0.975) 42(21.3,0.975)
Top Overlay:
  lines w0.2: -0.25,0.975 0.4,0.975 ; 1.225,0.95 19.675,0.95
3D body: height 0.3, standoff 0, extent 10.4,1.525 10.6,2.475
3D body: height 0.4, standoff 0, extent 10.4,1.525 10.6,1.825
3D body: height 0.3, standoff 0, extent 9.4,1.525 9.6,2.475
3D body: height 0.4, standoff 0, extent 9.4,1.525 9.6,1.825
3D body: height 0.3, standoff 0, extent 9.9,-0.525 10.1,0.425
3D body: height 0.4, standoff 0, extent 9.9,0.125 10.1,0.425
3D body: height 0.3, standoff 0, extent 8.9,-0.525 9.1,0.425
3D body: height 0.4, standoff 0, extent 8.9,0.125 9.1,0.425
3D body: height 2.8, standoff 0.4, extent -2.55,-0.025 22.05,1.975
3D body: height 1, standoff 0.4, extent -2.55,-0.025 22.05,1.975
3D body: height 4.4, standoff 2.8, extent -3.05,-0.025 22.55,1.975
3D body: height 4.4, standoff 0.4, extent -1.1,-0.025 20.6,0.475
3D body: height 0.3, standoff 0, extent -0.1,-0.525 0.1,0.425
3D body: height 0.4, standoff 0, extent -0.1,0.125 0.1,0.425
3D body: height 2.6, standoff 0, extent -2.575,-0.05 -1.1,2
3D body: height 0.4, standoff 0, extent 0.9,0.125 1.1,0.425
3D body: height 0.3, standoff 0, extent 0.9,-0.525 1.1,0.425
3D body: height 0.4, standoff 0, extent 1.9,0.125 2.1,0.425
3D body: height 0.3, standoff 0, extent 1.9,-0.525 2.1,0.425
3D body: height 0.4, standoff 0, extent 2.9,0.125 3.1,0.425
3D body: height 0.3, standoff 0, extent 2.9,-0.525 3.1,0.425
3D body: height 0.4, standoff 0, extent 3.9,0.125 4.1,0.425
3D body: height 0.3, standoff 0, extent 3.9,-0.525 4.1,0.425
3D body: height 0.4, standoff 0, extent 4.9,0.125 5.1,0.425
3D body: height 0.3, standoff 0, extent 4.9,-0.525 5.1,0.425
3D body: height 0.4, standoff 0, extent 5.9,0.125 6.1,0.425
3D body: height 0.3, standoff 0, extent 5.9,-0.525 6.1,0.425
3D body: height 0.4, standoff 0, extent 6.9,0.125 7.1,0.425
3D body: height 0.3, standoff 0, extent 6.9,-0.525 7.1,0.425
3D body: height 0.4, standoff 0, extent 7.9,0.125 8.1,0.425
3D body: height 0.3, standoff 0, extent 7.9,-0.525 8.1,0.425
3D body: height 0.4, standoff 0, extent 8.4,1.525 8.6,1.825
3D body: height 0.3, standoff 0, extent 8.4,1.525 8.6,2.475
3D body: height 0.4, standoff 0, extent 7.4,1.525 7.6,1.825
3D body: height 0.3, standoff 0, extent 7.4,1.525 7.6,2.475
3D body: height 0.4, standoff 0, extent 6.4,1.525 6.6,1.825
3D body: height 0.3, standoff 0, extent 6.4,1.525 6.6,2.475
3D body: height 0.4, standoff 0, extent 5.4,1.525 5.6,1.825
3D body: height 0.3, standoff 0, extent 5.4,1.525 5.6,2.475
3D body: height 0.4, standoff 0, extent 4.4,1.525 4.6,1.825
3D body: height 0.3, standoff 0, extent 4.4,1.525 4.6,2.475
3D body: height 0.4, standoff 0, extent 3.4,1.525 3.6,1.825
3D body: height 0.3, standoff 0, extent 3.4,1.525 3.6,2.475
3D body: height 0.4, standoff 0, extent 2.4,1.525 2.6,1.825
3D body: height 0.3, standoff 0, extent 2.4,1.525 2.6,2.475
3D body: height 0.4, standoff 0, extent 1.4,1.525 1.6,1.825
3D body: height 0.3, standoff 0, extent 1.4,1.525 1.6,2.475
3D body: height 0.4, standoff 0, extent 0.4,1.525 0.6,1.825
3D body: height 0.3, standoff 0, extent 0.4,1.525 0.6,2.475
3D body: height 0.3, standoff 0, extent 10.9,-0.525 11.1,0.425
3D body: height 0.4, standoff 0, extent 10.9,0.125 11.1,0.425
3D body: height 2.6, standoff 0, extent 20.6,-0.05 22.075,2
3D body: height 0.4, standoff 0, extent 11.9,0.125 12.1,0.425
3D body: height 0.3, standoff 0, extent 11.9,-0.525 12.1,0.425
3D body: height 0.4, standoff 0, extent 12.9,0.125 13.1,0.425
3D body: height 0.3, standoff 0, extent 12.9,-0.525 13.1,0.425
3D body: height 0.4, standoff 0, extent 13.9,0.125 14.1,0.425
3D body: height 0.3, standoff 0, extent 13.9,-0.525 14.1,0.425
3D body: height 0.4, standoff 0, extent 14.9,0.125 15.1,0.425
3D body: height 0.3, standoff 0, extent 14.9,-0.525 15.1,0.425
3D body: height 0.4, standoff 0, extent 15.9,0.125 16.1,0.425
3D body: height 0.3, standoff 0, extent 15.9,-0.525 16.1,0.425
3D body: height 0.4, standoff 0, extent 16.9,0.125 17.1,0.425
3D body: height 0.3, standoff 0, extent 16.9,-0.525 17.1,0.425
3D body: height 0.4, standoff 0, extent 17.9,0.125 18.1,0.425
3D body: height 0.3, standoff 0, extent 17.9,-0.525 18.1,0.425
3D body: height 0.4, standoff 0, extent 18.9,0.125 19.1,0.425
3D body: height 0.3, standoff 0, extent 18.9,-0.525 19.1,0.425
3D body: height 0.4, standoff 0, extent 19.4,1.525 19.6,1.825
3D body: height 0.3, standoff 0, extent 19.4,1.525 19.6,2.475
3D body: height 0.4, standoff 0, extent 18.4,1.525 18.6,1.825
3D body: height 0.3, standoff 0, extent 18.4,1.525 18.6,2.475
3D body: height 0.4, standoff 0, extent 17.4,1.525 17.6,1.825
3D body: height 0.3, standoff 0, extent 17.4,1.525 17.6,2.475
3D body: height 0.4, standoff 0, extent 16.4,1.525 16.6,1.825
3D body: height 0.3, standoff 0, extent 16.4,1.525 16.6,2.475
3D body: height 0.4, standoff 0, extent 15.4,1.525 15.6,1.825
3D body: height 0.3, standoff 0, extent 15.4,1.525 15.6,2.475
3D body: height 0.4, standoff 0, extent 14.4,1.525 14.6,1.825
3D body: height 0.3, standoff 0, extent 14.4,1.525 14.6,2.475
3D body: height 0.4, standoff 0, extent 13.4,1.525 13.6,1.825
3D body: height 0.3, standoff 0, extent 13.4,1.525 13.6,2.475
3D body: height 0.4, standoff 0, extent 12.4,1.525 12.6,1.825
3D body: height 0.3, standoff 0, extent 12.4,1.525 12.6,2.475
3D body: height 0.4, standoff 0, extent 11.4,1.525 11.6,1.825
3D body: height 0.3, standoff 0, extent 11.4,1.525 11.6,2.475

## FPC1.0-6P-S-DOWN [mm]
pads (8):
  rect 0.5x1.7 smd: 1(0,0) 2(1,0) 3(2,0) 4(3,0) 5(4,0) 6(5,0)
  rect 1.4x2 smd: 7(-2.4,2.6) 8(7.4,2.6)
3D body: height 2, standoff 0.05, extent -2.9,0.075 7.9,4.375
3D body: height 0.7, standoff 0.05, extent -2.9,0.075 7.9,4.375
3D body: height 0.2, standoff 0, extent -0.15,-0.625 0.15,0.575
3D body: height 1.9, standoff 0, extent -0.15,-0.025 0.15,0.875
3D body: height 1.9, standoff 1.2, extent -2.7,2.375 7.7,5.575
3D body: height 1.9, standoff 0.5, extent -2.7,4.375 -1,5.575
3D body: height 2, standoff 1.9, extent -0.15,2.475 0.15,3.625
3D body: height 2, standoff 1.9, extent 0.85,2.475 1.15,3.625
3D body: height 1.9, standoff 0, extent 0.85,-0.025 1.15,0.875
3D body: height 0.2, standoff 0, extent 0.85,-0.625 1.15,0.575
3D body: height 2, standoff 1.9, extent 1.85,2.475 2.15,3.625
3D body: height 1.9, standoff 0, extent 1.85,-0.025 2.15,0.875
3D body: height 0.2, standoff 0, extent 1.85,-0.625 2.15,0.575
3D body: height 2, standoff 1.9, extent 2.85,2.475 3.15,3.625
3D body: height 1.9, standoff 0, extent 2.85,-0.025 3.15,0.875
3D body: height 0.2, standoff 0, extent 2.85,-0.625 3.15,0.575
3D body: height 2, standoff 1.9, extent 3.85,2.475 4.15,3.625
3D body: height 1.9, standoff 0, extent 3.85,-0.025 4.15,0.875
3D body: height 0.2, standoff 0, extent 3.85,-0.625 4.15,0.575
3D body: height 2, standoff 1.9, extent 4.85,2.475 5.15,3.625
3D body: height 1.9, standoff 0, extent 4.85,-0.025 5.15,0.875
3D body: height 0.2, standoff 0, extent 4.85,-0.625 5.15,0.575
3D body: height 2, standoff 1.9, extent -2.7,4.55 7.7,5.575
3D body: height 0.2, standoff 0, extent -3,1.775 -2,3.475
3D body: height 0.2, standoff 0, extent 7,1.775 8,3.475
3D body: height 1.9, standoff 0.5, extent 6,4.375 7.7,5.575

## FPC1.0-6P-S-UP-DOWN [mm]
pads (8):
  rect 0.6x2 smd: 1(0,0) 2(1,0) 3(2,0) 4(3,0) 5(4,0) 6(5,0)
  rect 1.9x2.4 smd: 7(-2.1,2.6) 8(7.1,2.6)
3D body: height 0.2, standoff 0, extent 6.1,0.8 7.7,2.9
3D body: height 2.05, standoff 0, extent -0.15,0.5 0.15,0.8
3D body: height 0.2, standoff 0, extent -0.15,-0.7 0.15,0.5
3D body: height 0.2, standoff 0, extent -2.7,0.8 -1.1,2.9
3D body: height 2, standoff 1.5, extent -2.5,0.7 7.5,5.7
3D body: height 0.2, standoff 0, extent 0.85,-0.7 1.15,0.5
3D body: height 2.05, standoff 0, extent 0.85,0.5 1.15,0.8
3D body: height 0.2, standoff 0, extent 1.85,-0.7 2.15,0.5
3D body: height 2.05, standoff 0, extent 1.85,0.5 2.15,0.8
3D body: height 0.2, standoff 0, extent 2.85,-0.7 3.15,0.5
3D body: height 2.05, standoff 0, extent 2.85,0.5 3.15,0.8
3D body: height 0.2, standoff 0, extent 3.85,-0.7 4.15,0.5
3D body: height 2.05, standoff 0, extent 3.85,0.5 4.15,0.8
3D body: height 0.2, standoff 0, extent 4.85,-0.7 5.15,0.5
3D body: height 2.05, standoff 0, extent 4.85,0.5 5.15,0.8
3D body: height 0.5, standoff 0, extent -2.5,0.7 7.5,5.7
3D body: height 2, standoff 0, extent -2.5,0.7 -1.1,5.7
3D body: height 2, standoff 0, extent 6.1,0.7 7.5,5.7
3D body: height 2, standoff 0, extent -2.5,0.8 7.5,1.3

## FPC1.0-8P-S-DOWN [mm]
pads (10):
  rect 0.5x1.7 smd: 1(0,0) 2(1,0) 3(2,0) 4(3,0) 5(4,0) 6(5,0) 7(6,0) 8(7,0)
  rect 1.4x2 smd: 9(9.4,2.6) 10(-2.4,2.6)
3D body: height 0.2, standoff 0, extent -3,1.775 -2,3.475
3D body: height 2, standoff 1.9, extent -2.7,4.55 9.7,5.575
3D body: height 0.2, standoff 0, extent 4.85,-0.625 5.15,0.575
3D body: height 1.9, standoff 0, extent 4.85,-0.025 5.15,0.875
3D body: height 2, standoff 1.9, extent 4.85,2.475 5.15,3.625
3D body: height 0.2, standoff 0, extent 3.85,-0.625 4.15,0.575
3D body: height 1.9, standoff 0, extent 3.85,-0.025 4.15,0.875
3D body: height 2, standoff 1.9, extent 3.85,2.475 4.15,3.625
3D body: height 0.2, standoff 0, extent 2.85,-0.625 3.15,0.575
3D body: height 1.9, standoff 0, extent 2.85,-0.025 3.15,0.875
3D body: height 2, standoff 1.9, extent 2.85,2.475 3.15,3.625
3D body: height 0.2, standoff 0, extent 1.85,-0.625 2.15,0.575
3D body: height 1.9, standoff 0, extent 1.85,-0.025 2.15,0.875
3D body: height 2, standoff 1.9, extent 1.85,2.475 2.15,3.625
3D body: height 0.2, standoff 0, extent 0.85,-0.625 1.15,0.575
3D body: height 1.9, standoff 0, extent 0.85,-0.025 1.15,0.875
3D body: height 2, standoff 1.9, extent 0.85,2.475 1.15,3.625
3D body: height 2, standoff 1.9, extent -0.15,2.475 0.15,3.625
3D body: height 1.9, standoff 0.5, extent -2.7,4.375 -1,5.575
3D body: height 1.9, standoff 1.2, extent -2.7,2.375 9.7,5.575
3D body: height 1.9, standoff 0, extent -0.15,-0.025 0.15,0.875
3D body: height 0.2, standoff 0, extent -0.15,-0.625 0.15,0.575
3D body: height 0.7, standoff 0.05, extent -2.9,0.075 9.9,4.375
3D body: height 2, standoff 0.05, extent -2.9,0.075 9.9,4.375
3D body: height 1.9, standoff 0, extent 5.85,-0.025 6.15,0.875
3D body: height 0.2, standoff 0, extent 5.85,-0.625 6.15,0.575
3D body: height 1.9, standoff 0, extent 6.85,-0.025 7.15,0.875
3D body: height 0.2, standoff 0, extent 6.85,-0.625 7.15,0.575
3D body: height 0.2, standoff 0, extent 9,1.775 10,3.475
3D body: height 1.9, standoff 0.5, extent 8,4.375 9.7,5.575
3D body: height 2, standoff 1.9, extent 5.85,2.475 6.15,3.625
3D body: height 2, standoff 1.9, extent 6.85,2.475 7.15,3.625